# Altium footprint library AD_Lib.PcbLib: 508 footprints (part 3 of 32)
Each footprint in its own frame and in the unit in brackets; x right, y up, seen from the top. Pads: shape width x height; smd on the part's side, far side on the other; paste and mask are expansions set on the pad; w line width, h text height; cw(c..) or ccw(c..) is an arc to the next point about the centre after c.
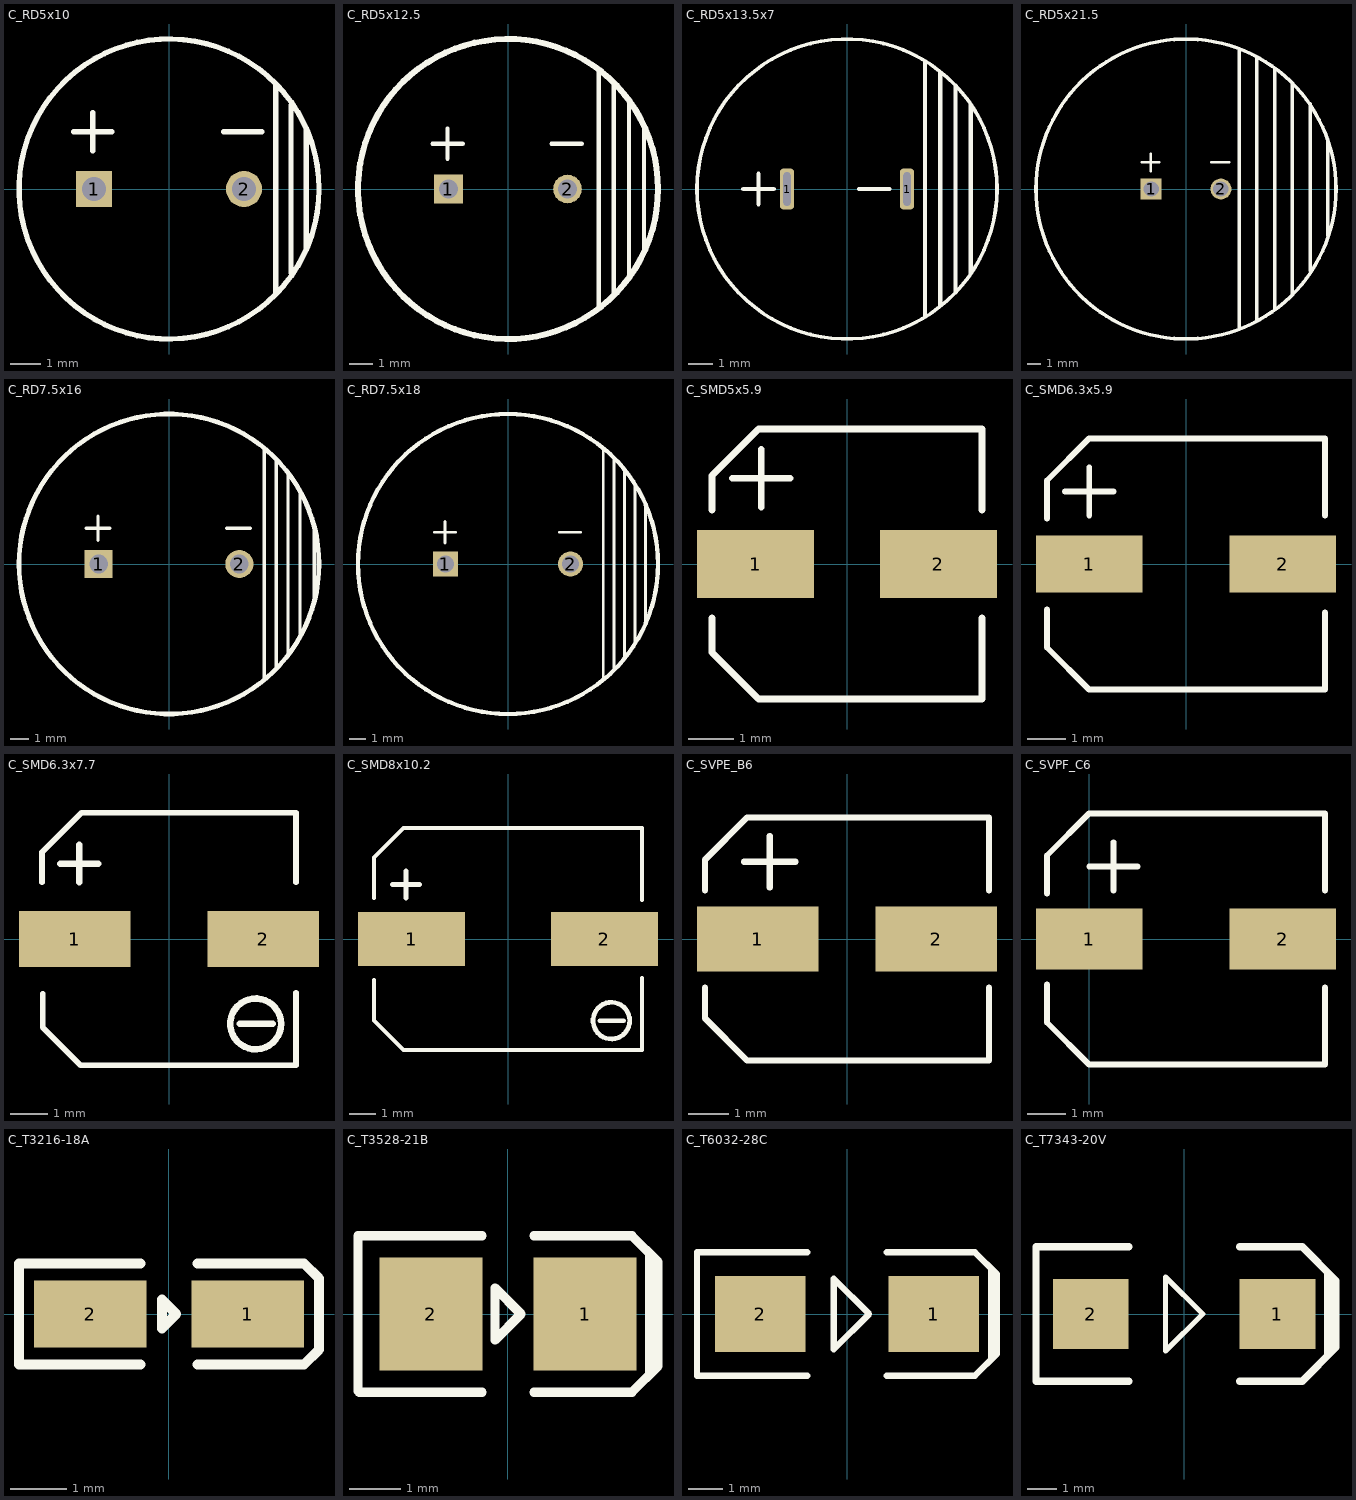
[diagram p2: the footprints below, top view; thin cyan lines are the x and y axes]

## C_RD5x10 [mm] "直插电解电容"
height 16
pads (2):
  rect 1.2x1.2 hole 0.8: 1(-2.5,0)
  round 1.2 hole 0.8: 2(2.5,0)
Top Overlay:
  circle w0.178: c0,0 r5
  lines w0.178: -3.175,1.905 -1.905,1.905 ; -2.54,1.27 -2.54,2.54 ; 1.825,1.905 3.095,1.905 ; 3.556,-3.429 3.556,3.429 ; 4.064,-2.794 4.064,2.794 ; 4.572,-2.032 4.572,2.032
Bottom Overlay:
  lines w0.178: -3.175,1.905 -1.905,1.905 ; -2.54,1.27 -2.54,2.54

## C_RD5x12.5 [mm] "直插电解电容"
height 22
pads (2):
  rect 1.2x1.2 hole 0.8: 1(-2.5,0)
  round 1.2 hole 0.8: 2(2.5,0)
Top Overlay:
  circle w0.254: c0,0 r6.3
  lines w0.178: -3.175,1.905 -1.905,1.905 ; -2.54,1.27 -2.54,2.54 ; 1.825,1.905 3.095,1.905 ; 3.81,-4.953 3.81,4.953 ; 4.445,-4.445 4.445,4.445 ; 5.08,-3.683 5.08,3.683 ; 5.715,-2.54 5.715,2.667
Bottom Overlay:
  lines w0.178: -3.175,1.905 -1.905,1.905 ; -2.54,1.27 -2.54,2.54

## C_RD5x13.5x7 [mm] "超级电容， KORCHIP(高奇普)之DCS5R5474C"
height 7
pads (2):
  rrect50% 0.6x1.7 hole 0.3 slot 1.4 at 90 deg: 1(-2.5,0) 1(2.5,0)
Top Overlay:
  circle w0.152: c0,0 r6.25
  lines w0.178: -4.318,0 -3.048,0 ; -3.683,-0.635 -3.683,0.635 ; 0.5,0 1.77,0 ; 3.251,-5.309 3.251,5.283 ; 3.886,-4.851 3.886,4.851 ; 4.521,-4.293 4.521,4.267 ; 5.156,-3.505 5.156,3.505
Bottom Overlay:
  lines w0.178: -4.318,0 -3.048,0 ; -3.683,-0.635 -3.683,0.635

## C_RD5x21.5 [mm] "松下NF系列超级电容，EECF5R5U155"
height 8
pads (2):
  rect 1.5x1.5 hole 1.1: 1(-2.5,0)
  round 1.5 hole 1.1: 2(2.5,0)
Top Overlay:
  circle w0.254: c0,0 r10.75
  lines w0.178: -3.175,1.905 -1.905,1.905 ; -2.54,1.27 -2.54,2.54 ; 1.825,1.905 3.095,1.905
  lines w0.254: 3.81,-9.906 3.81,9.906 ; 5.08,-9.398 5.08,9.398 ; 6.35,-8.636 6.35,8.636 ; 7.62,-7.62 7.62,7.62 ; 8.89,-5.842 8.89,6.096 ; 10.16,-3.302 10.16,3.556
Bottom Overlay:
  lines w0.178: -3.175,1.905 -1.905,1.905 ; -2.54,1.27 -2.54,2.54

## C_RD7.5x16 [mm] "直插电解电容"
height 25
pads (2):
  rect 1.5x1.5 hole 1: 1(-3.75,0)
  round 1.5 hole 1: 2(3.75,0)
Top Overlay:
  circle w0.254: c0,0 r8
  lines w0.178: -4.425,1.905 -3.155,1.905 ; -3.79,1.27 -3.79,2.54 ; 3.075,1.905 4.345,1.905 ; 5.08,-6.096 5.08,6.223 ; 5.715,-5.461 5.715,5.588 ; 6.35,-4.699 6.35,4.826 ; 6.985,-3.81 6.985,3.81 ; 7.747,-2.032 7.747,2.159
Bottom Overlay:
  lines w0.178: -4.425,1.905 -3.155,1.905 ; -3.79,1.27 -3.79,2.54

## C_RD7.5x18 [mm] "直插电解电容"
height 25
pads (2):
  rect 1.5x1.5 hole 1: 1(-3.75,0)
  round 1.5 hole 1: 2(3.75,0)
Top Overlay:
  circle w0.254: c0,0 r9
  lines w0.178: -4.425,1.905 -3.155,1.905 ; -3.79,1.27 -3.79,2.54 ; 3.075,1.905 4.345,1.905 ; 5.715,-6.858 5.715,6.858 ; 6.35,-6.35 6.35,6.35 ; 6.985,-5.588 6.985,5.588 ; 7.62,-4.826 7.62,4.826 ; 8.255,-3.556 8.255,3.556
Bottom Overlay:
  lines w0.178: -4.425,1.905 -3.155,1.905 ; -3.79,1.27 -3.79,2.54

## C_SMD5x5.9 [mm] "Panasonic之SVPE系列固态电容，尺寸代码=B6"
height 5.9
pads (2):
  rect 2.6x1.5 smd paste-0.051 mask+0.076: 1(-2.032,0) 2(2.032,0)
Top Overlay:
  lines w0.152: -3,-1.199 -3,-1.961 -1.961,-3 3,-3 3,-1.199 ; -3,1.199 -3,1.961 -1.961,3 3,3 3,1.199 ; -2.54,1.905 -1.27,1.905 ; -1.905,1.27 -1.905,2.54

## C_SMD6.3x5.9 [mm] "Panasonic之SVPE系列固态电容，尺寸代码=C6"
height 5.9
pads (2):
  rect 2.8x1.5 smd paste-0.051 mask+0.076: 1(-2.54,0) 2(2.54,0)
Top Overlay:
  lines w0.152: -3.65,-1.199 -3.65,-2.192 -2.542,-3.3 3.65,-3.3 3.65,-1.27 ; -3.65,1.199 -3.65,2.192 -2.542,3.3 3.65,3.3 3.65,1.27 ; -3.175,1.905 -1.905,1.905 ; -2.54,1.27 -2.54,2.54

## C_SMD6.3x7.7 [mm] "Panasonic,  Series : ZA  Type : V"
height 8
pads (2):
  rect 3x1.5 smd paste-0.051 mask+0.076: 1(-2.54,0) 2(2.54,0)
Top Overlay:
  circle w0.178: c2.335,-2.286 r0.684
  lines w0.152: -3.421,1.524 -3.421,2.337 ; -3.408,2.349 -2.358,3.4 3.421,3.4 ; -3.4,-1.473 -3.4,-2.383 -2.383,-3.4 3.421,-3.4 3.421,-1.45 ; 3.421,1.524 3.421,3.398
  lines w0.178: -2.921,2.032 -1.905,2.032 ; -2.413,1.524 -2.413,2.54 ; 1.905,-2.286 2.794,-2.286

## C_SMD8x10.2 [mm] "Panasonic之FV系列K型"
height 10.2
pads (2):
  rect 4x2 smd paste-0.051 mask+0.076: 1(-3.6,0) 2(3.6,0)
Top Overlay:
  circle w0.178: c3.859,-3.048 r0.684
  lines w0.152: -5,-1.524 -5,-3.048 -3.898,-4.15 5,-4.15 5,-1.45 ; -5,1.524 -5,3.048 -3.898,4.15 5,4.15 5,1.45
  lines w0.178: -4.318,2.032 -3.302,2.032 ; -3.81,1.524 -3.81,2.54 ; 3.429,-3.048 4.318,-3.048

## C_SVPE_B6 [mm] "Panasonic之铝有机聚合物电容器"
pads (2):
  rect 3x1.6 smd paste-0.051 mask+0.076: 1(-2.2,0) 2(2.2,0)
Top Overlay:
  lines w0.152: -3.5,-1.199 -3.5,-1.961 -2.461,-3 3.5,-3 3.5,-1.199 ; -3.5,1.199 -3.5,1.961 -2.461,3 3.5,3 3.5,1.199 ; -2.54,1.905 -1.27,1.905 ; -1.905,1.27 -1.905,2.54

## C_SVPF_C6 [mm] "Panasonic之铝有机聚合物电容器"
height 12.5
pads (2):
  rect 2.8x1.6 smd paste-0.051 mask+0.076: 1(0,0) 2(5.08,0)
Top Overlay:
  lines w0.152: -1.11,-1.199 -1.11,-2.192 -0.002,-3.3 6.19,-3.3 6.19,-1.27 ; -1.11,1.199 -1.11,2.192 -0.002,3.3 6.19,3.3 6.19,1.27 ; 0,1.905 1.27,1.905 ; 0.635,1.27 0.635,2.54

## C_T3216-18A [mm] "钽电容；KEMET-A型封装"
height 1.8
pads (2):
  rect 2x1.2 smd: 1(1.4,0) 2(-1.4,0)
Top Overlay:
  lines w0.178: -0.508,-0.9 -2.667,-0.9 -2.667,0.9 -0.508,0.9 ; 0.508,-0.9 2.402,-0.9 2.667,-0.635 2.667,0.635 2.402,0.9 0.508,0.9 ; -0.127,-0.254 0.127,0 -0.127,0.254 -0.127,-0.254

## C_T3528-21B [mm] "钽电容；KEMET-B型"
height 1.905
pads (2):
  rect 2x2.2 smd: 1(1.5,0) 2(-1.5,0)
Top Overlay:
  region: 2.921,1.143 2.667,1.143 2.667,-1.143 2.921,-1.143
  lines w0.178: -2.921,-1.5 -2.921,1.524 -0.508,1.524 ; -2.897,-1.524 -0.508,-1.524 ; 0.508,-1.524 2.413,-1.524 2.921,-1.016 2.921,1.016 2.413,1.524 0.508,1.524 ; -0.254,-0.508 -0.254,0.508 0.254,0 -0.254,-0.508

## C_T6032-28C [mm] "钽电容；KEMET-C型"
height 2.591
pads (2):
  rect 2.6x2.2 smd: 1(2.5,0) 2(-2.5,0)
Top Overlay:
  rectangle: 4.064,-1.27 4.318,1.27
  lines w0.178: -1.143,-1.778 -4.318,-1.778 -4.318,1.778 -1.143,1.778 ; 1.143,-1.778 3.683,-1.778 4.318,-1.143 4.318,1.143 3.683,1.778 1.143,1.778 ; -0.381,-1.016 -0.381,0.762 -0.381,1.016 0.635,0 -0.381,-1.016

## C_T7343-20V [mm] "钽电容；KEMET-V型"
height 2.388
pads (2):
  rect 2.6x2.4 smd: 1(3.2,0) 2(-3.2,0)
Top Overlay:
  rectangle: 4.801,-1.397 5.08,1.397
  lines w0.178: -0.635,-1.27 0.635,0 -0.635,1.27 -0.635,-1.27
  lines w0.254: -1.905,-2.3 -5.08,-2.3 -5.08,2.3 -1.905,2.3 ; 1.905,-2.3 4.05,-2.3 5.207,-1.143 5.207,1.143 4.05,2.3 1.905,2.3